# Altium footprint library Libraries_2014_0618.PcbLib: 391 footprints (part 4 of 25)
Each footprint in its own frame and in the unit in brackets; x right, y up, seen from the top. Pads: shape width x height; smd on the part's side, far side on the other; paste and mask are expansions set on the pad; w line width, h text height; cw(c..) or ccw(c..) is an arc to the next point about the centre after c.
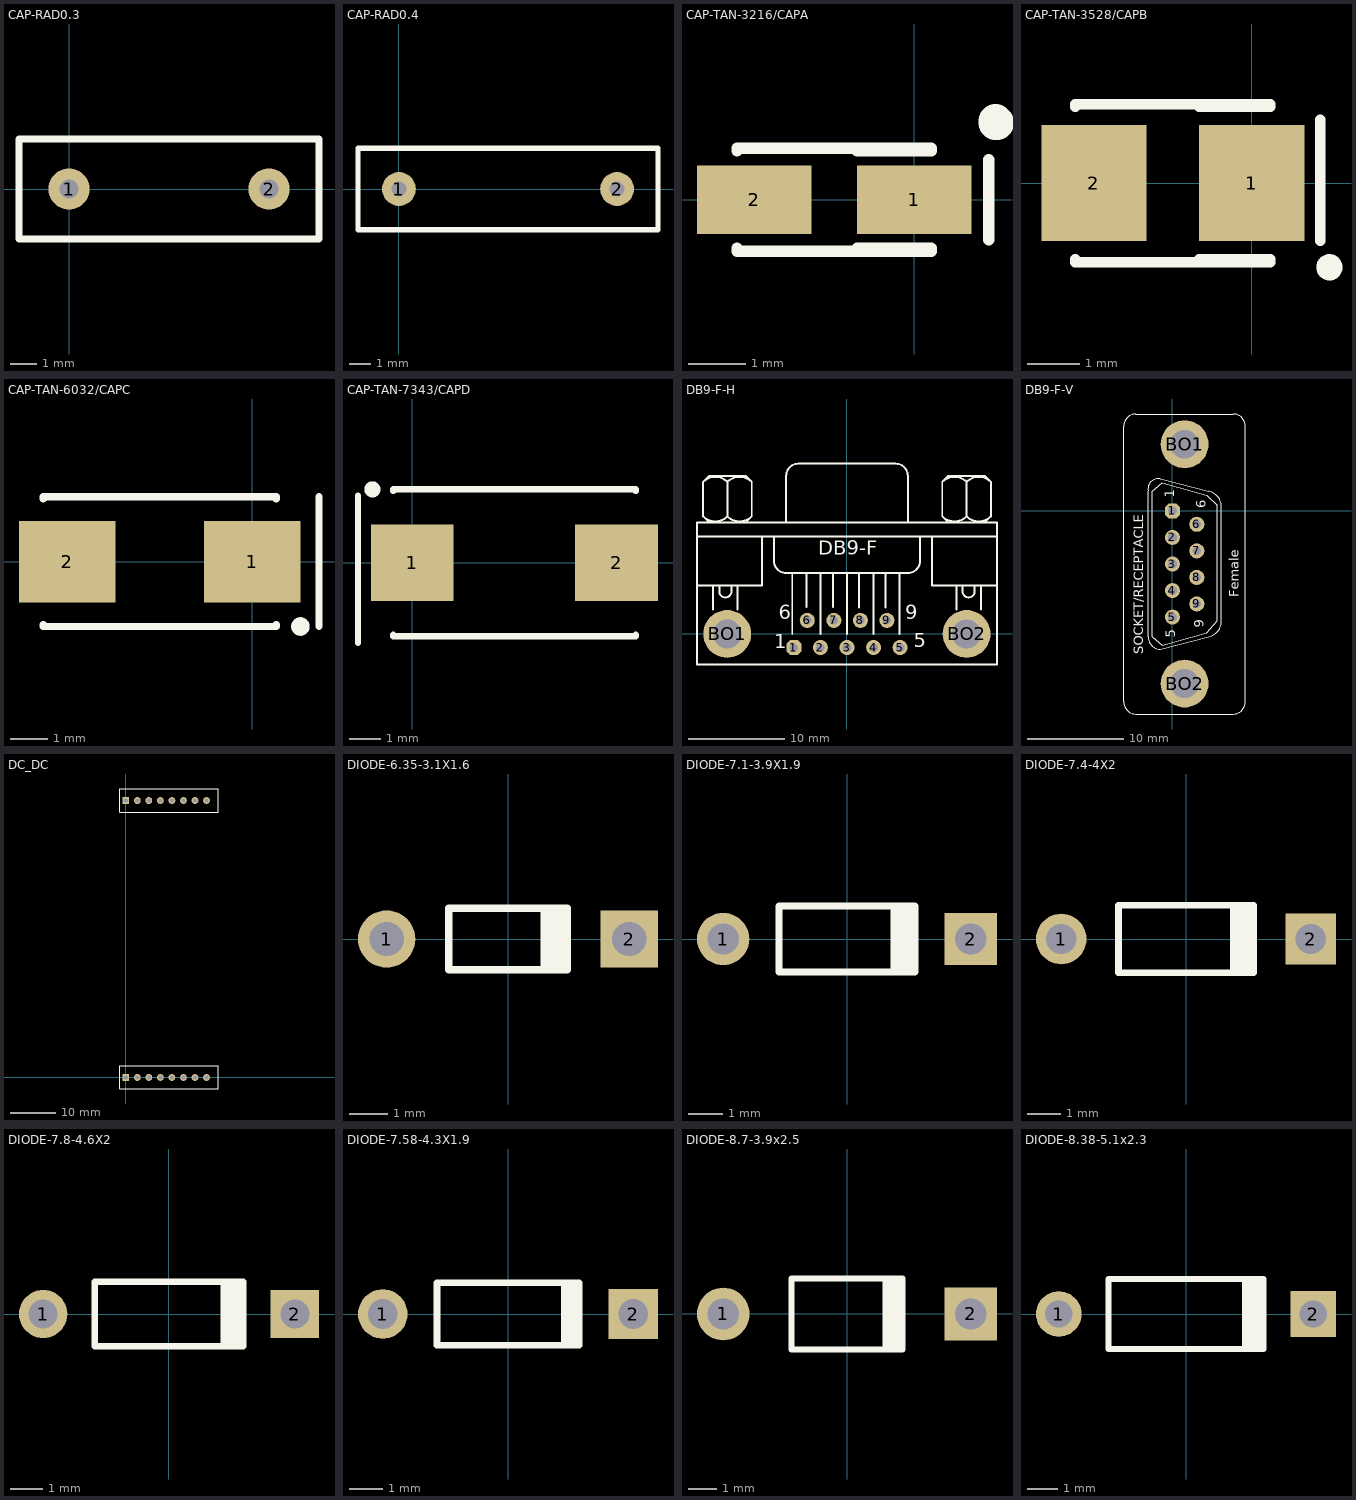
[diagram p3: the footprints below, top view; thin cyan lines are the x and y axes]

## CAP-RAD0.3 [mil]
pads (2):
  round 62 hole 28: 1(0,0) 2(300,0)
Top Overlay:
  lines w10: -75,-75 375,-75 375,75 -75,75 -75,-75

## CAP-RAD0.4 [mil]
pads (2):
  round 62 hole 28: 1(0,0) 2(400,0)
Top Overlay:
  lines w10: -75,-75 475,-75 475,75 -75,75 -75,-75

## CAP-TAN-3216/CAPA [mm]
pads (2):
  rect 2x1.2 smd: 1(0,0) 2(-2.8,0)
Top Overlay:
  lines w0.2: -3.1,-0.85 -3.1,-0.9 0.3,-0.9 ; -3.1,0.85 -3.1,0.9 0.3,0.9 ; -1,-0.85 0.3,-0.85 ; -1,0.85 0.3,0.85 ; 1.3,-0.7 1.3,0.7
  lines w0.6: 1.422,1.372 1.422,1.346 1.448,1.346

## CAP-TAN-3528/CAPB [mm]
pads (2):
  rect 2x2.2 smd: 1(0,0) 2(-3,0)
Top Overlay:
  circle w0.25: c1.475,-1.6 r0.125
  lines w0.2: -3.35,-1.45 -3.35,-1.5 0.35,-1.5 ; -3.35,1.45 -3.35,1.5 0.35,1.5 ; -1,-1.45 0.35,-1.45 ; -1,1.45 0.35,1.45 ; 1.3,-1.1 1.3,1.2

## CAP-TAN-6032/CAPC [mm]
pads (2):
  rect 2.6x2.2 smd: 1(0,0) 2(-5,0)
Top Overlay:
  circle w0.25: c1.3,-1.75 r0.125
  lines w0.2: -5.65,-1.7 -5.65,-1.75 0.65,-1.75 0.65,-1.7 ; -5.65,1.7 -5.65,1.75 0.65,1.75 0.65,1.7 ; 1.8,-1.75 1.8,1.75

## CAP-TAN-7343/CAPD [mm]
pads (2):
  rect 2.6x2.4 smd: 1(0,0) 2(6.4,0)
Top Overlay:
  circle w0.25: c-1.25,2.3 r0.125
  lines w0.2: -1.7,-2.5 -1.7,2.1 ; -0.6,-2.25 -0.6,-2.3 7,-2.3 7,-2.25 ; -0.6,2.25 -0.6,2.3 7,2.3 7,2.25

## DB9-F-H [mil]
pads (11):
  oct 62x62 hole 35: 1(-217.92,-55.83)
  round 62 hole 35: 2(-108.75,-55.83) 3(0.42,-55.83) 4(109.58,-55.83) 5(218.75,-55.83) 6(-162.92,55.83) 7(-53.75,55.83) 8(55.42,55.83) 9(164.58,55.83)
  round 196.67 hole 118.33: BO1(-492.08,0) BO2(492.08,0)
Top Overlay:
  lines w8: -616.25,200 -349.58,200 -349.58,400 ; -616.25,400 617.08,400 ; -591.34,483.25 ccw(c-541.25,533.33) -491.16,483.25 ; -591.34,625.09 cw(c-541.25,575) -491.16,625.09 ; -566.25,458.33 -591.25,483.33 -591.25,625 -566.25,650 -416.25,650 -391.25,625 -391.25,483.33 -416.25,458.33 ; -549.58,100 -549.58,200 ; -524.58,200 -524.58,175 ccw(c-499.58,175) -474.58,175 -474.58,200 ; -491.34,483.25 ccw(c-441.25,533.33) -391.16,483.25 ; -491.34,625.09 cw(c-441.25,575) -391.16,625.09 ; -491.25,483.33 -491.25,625 ; -449.58,100 -449.58,200 ; -299.58,400 -299.58,300 ccw(c-249.58,300) -249.58,250 250.42,250 ccw(c250.42,300) 300.42,300 300.42,400 ; -249.58,458.33 -249.58,650 cw(c-199.58,650) -199.58,700 175.42,700 200.42,700 cw(c200.42,650) 250.42,650 250.42,458.33 ; -224.58,0 -224.58,250 ; -166.25,110.24 -166.25,250 ; -107.92,0 -107.92,250 ; -57.92,110.24 -57.92,250 ; 0.42,0 0.42,250 ; 50.42,108.27 50.42,250 ; 108.75,0 108.75,250 ; 158.75,108.27 158.75,250 ; 217.08,0 217.08,250 ; 350.42,400 350.42,200 617.08,200 ; 392,483.25 ccw(c442.08,533.33) 492.17,483.25 ; 392,625.09 cw(c442.08,575) 492.17,625.09 ; 417.08,458.33 392.08,483.33 392.08,625 417.08,650 567.08,650 592.08,625 592.08,483.33 567.08,458.33 ; 450.42,100 450.42,200 ; 475.42,200 475.42,175 ccw(c500.42,175) 525.42,175 525.42,200 ; 492,483.25 ccw(c542.08,533.33) 592.17,483.25 ; 492,625.09 cw(c542.08,575) 592.17,625.09 ; 492.08,483.33 492.08,625 ; 550.42,100 550.42,200 ; -616.25,-125 617.08,-125 617.08,458.33 -616.25,458.33 -616.25,-125
  text "DB9-F" at -118.11,305.12 h100
  text "9" at 240.42,40 h100
  text "5" at 275.59,-74.8 h100
  text "1" at -299.58,-80 h100
  text "6" at -279.58,40 h100

## DB9-F-V [mil]
pads (11):
  oct 62x62 hole 35.43: 1(0,0)
  round 62 hole 35.43: 2(0,-109.17) 3(0,-218.33) 4(0,-327.5) 5(0,-436.67) 6(100,-55) 7(100,-164.17) 8(100,-273.33) 9(100,-382.5)
  oval 196.67x196.85 hole 118.33: BO1(50,274.17)
  round 196.67 hole 118.33: BO2(50,-710)
Top Overlay:
  lines w3.94: -100.05,81.89 cw(c-58.33,90) -50.22,131.72 ; -100,81.67 -100,-518.33 ccw(c-50,-518.33) -50,-568.33 150,-518.33 ; -50,131.67 150,81.67 ; 149.86,-517.97 ccw(c133.33,-451.67) 199.64,-468.2 ; 149.86,81.3 cw(c133.33,15) 199.64,31.53 ; 200,-468.33 200,31.67 ; -200,-785 ccw(c-150,-785) -150,-835 250,-835 ccw(c250,-785) 300,-785 300,348.33 ccw(c250,348.33) 250,398.33 -150,398.33 ccw(c-150,348.33) -200,348.33 -200,-785 ; -83.33,-518.33 -41.67,-551.67 141.67,-501.67 183.33,-451.67 183.33,23.33 141.67,65 -41.67,115 -83.33,81.67 -83.33,-518.33
  text "9" at 128.8,-479.97 h39.37
  text "6" at 136,11.33 h39.37
  text "5" at 10.7,-521.37 h39.37
  text "1" at 7,54.33 h39.37
  text "SOCKET/RECEPTACLE" at -121,-590 h39.37
  text "Female" at 272,-355 h39.37

## DC_DC [mm]
pads (16):
  rect 1.5x1.5 hole 0.9: 1(0,0) 3(0,60.96)
  round 1.5 hole 0.9: 2(17.78,0) 3(2.54,0) 4(17.78,60.96) 5(5.08,0) 5(5.08,60.96) 7(7.62,0) 7(7.62,60.96) 9(10.16,0) 9(10.16,60.96) 11(12.7,0) 11(12.7,60.96) 13(15.24,0) 13(15.24,60.96) 22(2.54,60.96)
Top Overlay:
  lines w0.2: 20.32,-2.54 -1.27,-2.54 -1.27,2.54 20.32,2.54 ; 20.32,58.42 -1.27,58.42 -1.27,63.5 20.32,63.5
  lines w0.254: 20.32,-2.54 20.32,2.54 ; 20.32,58.42 20.32,63.5

## DIODE-6.35-3.1X1.6 [mm] "Diode, Axial; Body 3 x 1.6 mm (LxDia. max), Lead Dia. 0.55 mm (max)"
height 1.6
pads (2):
  round 1.5 hole 0.9: 1(-3.175,0)
  rect 1.5x1.5 hole 0.9: 2(3.175,0)
Top Overlay:
  rectangle: 0.85,-0.8 1.65,0.8
  lines w0.2: 1.55,-0.8 -1.55,-0.8 -1.55,0.8 1.55,0.8

## DIODE-7.1-3.9X1.9 [mm] "Diode, Axial; Body 3.8 x 1.9 mm (LxDia. max), Lead Dia. 0.53 mm (max)"
height 1.9
pads (2):
  round 1.5 hole 0.9: 1(-3.55,0)
  rect 1.5x1.5 hole 0.9: 2(3.55,0)
Top Overlay:
  rectangle: 1.25,-0.95 2.05,0.95
  lines w0.2: 1.95,-0.95 -1.95,-0.95 -1.95,0.95 1.95,0.95

## DIODE-7.4-4X2 [mm] "Diode, Axial; Body 4 x 2 mm (LxDia. max), Lead Dia. 0.6 mm (max)"
height 2
pads (2):
  round 1.5 hole 0.9: 1(-3.7,0)
  rect 1.5x1.5 hole 0.9: 2(3.7,0)
Top Overlay:
  rectangle: 1.3,-1 2.1,1
  lines w0.2: 2,-1 -2,-1 -2,1 2,1

## DIODE-7.8-4.6X2 [mm] "Diode, Axial; Body 4.6 x 1.9 mm (LxDia. max), Lead Dia. 0.53 mm (max)"
height 2
pads (2):
  round 1.5 hole 0.9: 1(-3.9,0)
  rect 1.5x1.5 hole 0.9: 2(3.9,0)
Top Overlay:
  rectangle: 1.6,-1 2.4,1
  lines w0.2: 2.3,-1 -2.3,-1 -2.3,1 2.3,1

## DIODE-7.58-4.3X1.9 [mm] "Diode, Axial; Body 4.3 x 1.9 mm (LxDia. max), Lead Dia. 0.56 mm (max)"
height 1.9
pads (2):
  round 1.5 hole 0.9: 1(-3.79,0)
  rect 1.5x1.5 hole 0.9: 2(3.79,0)
Top Overlay:
  rectangle: 1.6,-0.95 2.25,0.95
  lines w0.2: 2.15,-0.95 -2.15,-0.95 -2.15,0.95 2.15,0.95

## DIODE-8.7-3.9x2.5 [mm] "Diode, Axial; Body 3.9 x 2.5 mm (LxDia. max), Lead Dia. 0.8 mm (max)"
height 2.5
pads (2):
  round 1.85 hole 1.1: 1(-4.35,0)
  rect 1.85x1.85 hole 1.1: 2(4.35,0)
Top Overlay:
  rectangle: 1.25,-1.25 2.05,1.25
  lines w0.2: 1.95,-1.25 -1.95,-1.25 -1.95,1.25 1.95,1.25

## DIODE-8.38-5.1x2.3 [mm] "Diode, Axial; Body 5.1 x 2.3 mm (LxDia. max), Lead Dia. 0.56 mm (max)"
height 2.3
pads (2):
  round 1.5 hole 0.9: 1(-4.19,0)
  rect 1.5x1.5 hole 0.9: 2(4.19,0)
Top Overlay:
  rectangle: 1.85,-1.15 2.65,1.15
  lines w0.2: 2.55,-1.15 -2.55,-1.15 -2.55,1.15 2.55,1.15